# Altium footprint library myPcbLib.PcbLib: 987 footprints (part 58 of 62)
Each footprint in its own frame and in the unit in brackets; x right, y up, seen from the top. Pads: shape width x height; smd on the part's side, far side on the other; paste and mask are expansions set on the pad; w line width, h text height; cw(c..) or ccw(c..) is an arc to the next point about the centre after c.
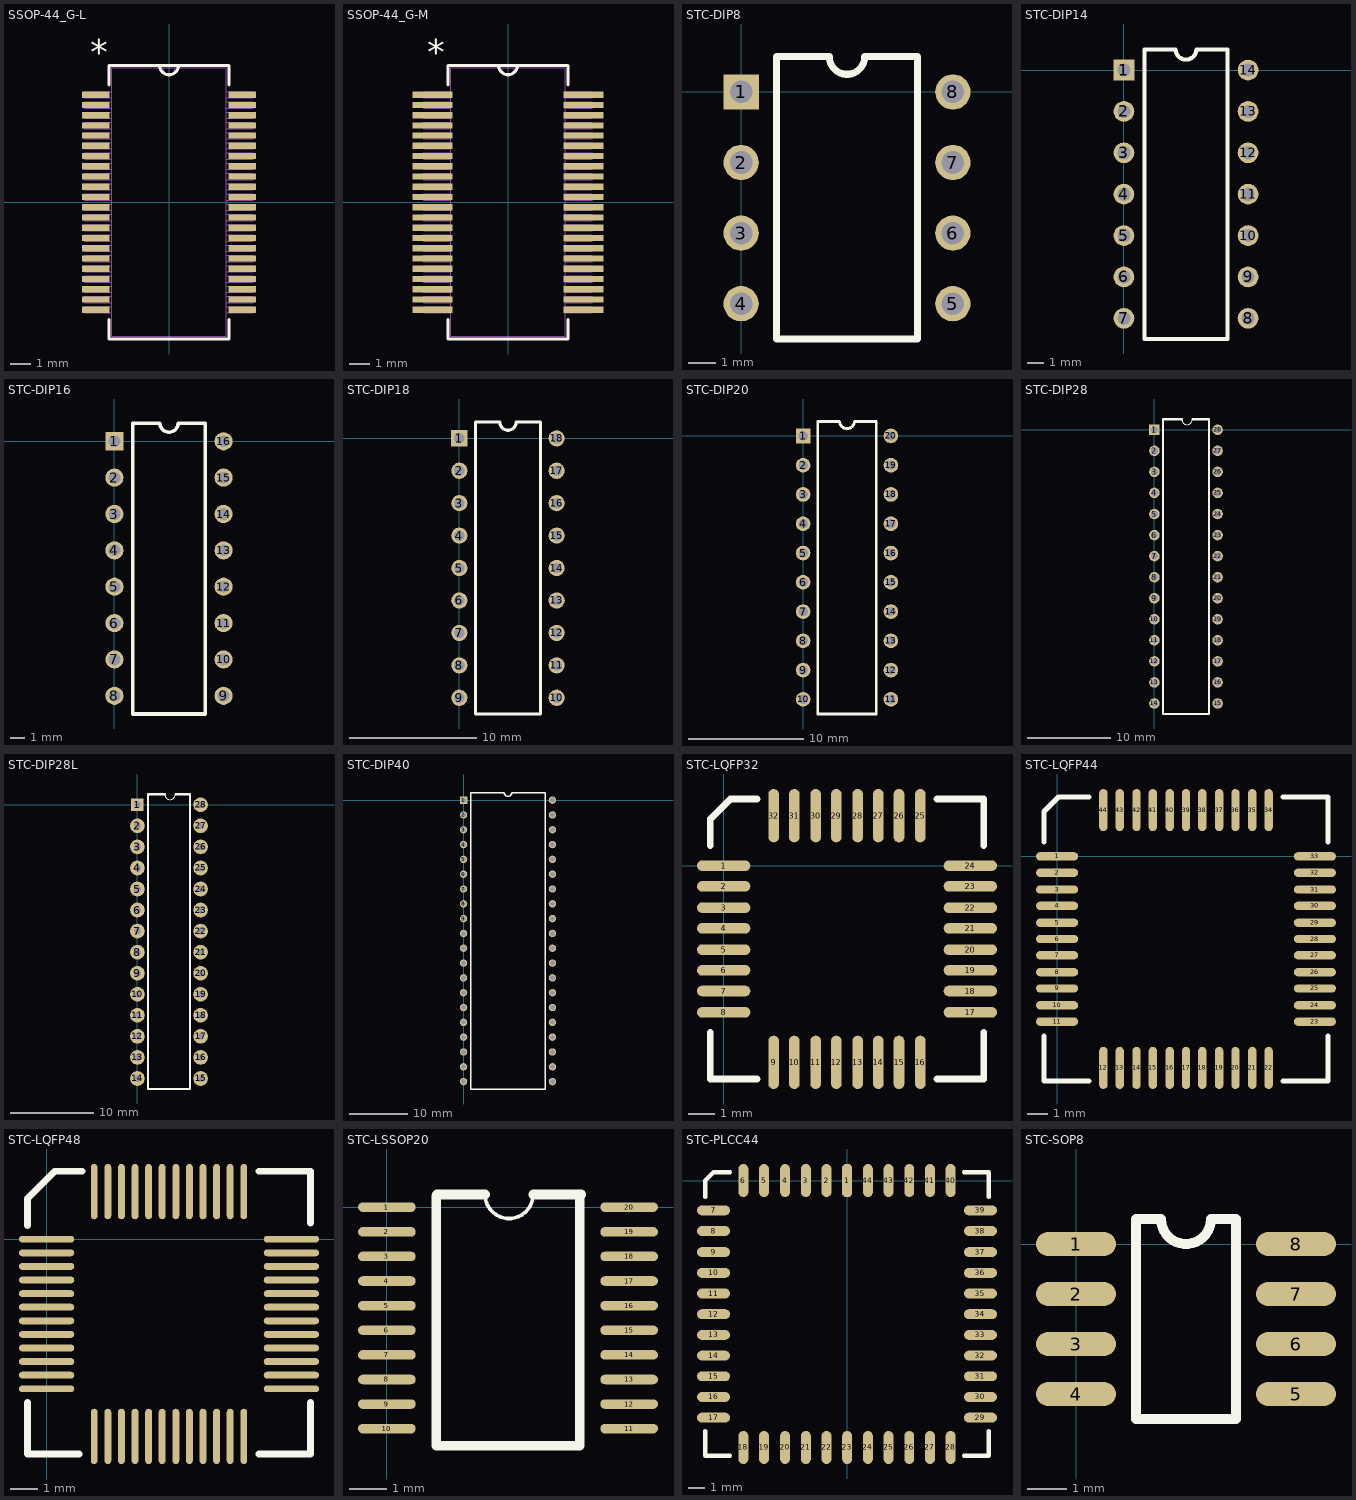
[diagram p57: the footprints below, top view; thin cyan lines are the x and y axes]

## SSOP-44_G-L [mil]
pads (44):
  rect 53x12 smd: 1(-141,206.64) 2(-141,186.96) 3(-141,167.28) 4(-141,147.6) 5(-141,127.92) 6(-141,108.24) 7(-141,88.56) 8(-141,68.88) 9(-141,49.2) 10(-141,29.52) 11(-141,9.84) 12(-141,-9.84) 13(-141,-29.52) 14(-141,-49.2) 15(-141,-68.88) 16(-141,-88.56) 17(-141,-108.24) 18(-141,-127.92) 19(-141,-147.6) 20(-141,-167.28) 21(-141,-186.96) 22(-141,-206.64) 23(141,-206.64) 24(141,-186.96) 25(141,-167.28) 26(141,-147.6) 27(141,-127.92) 28(141,-108.24) 29(141,-88.56) 30(141,-68.88) 31(141,-49.2) 32(141,-29.52) 33(141,-9.84) 34(141,9.84) 35(141,29.52) 36(141,49.2) 37(141,68.88) 38(141,88.56) 39(141,108.24) 40(141,127.92) 41(141,147.6) 42(141,167.28) 43(141,186.96) 44(141,206.64)
Top Overlay:
  lines w6: -115.5,-225.74 -115.5,-263 115.5,-263 115.5,-225.74 ; -115.5,225.74 -115.5,263 115.5,263 115.5,225.74 ; -18.11,263 ccw(c0,263) 18.11,263
  text "*" at -151,263.64 h50
Mechanical 1:
  drawing of 181 lines, arcs and shapes, not listed

## SSOP-44_G-M [mil]
pads (44):
  rect 77x12 smd: 1(-145,206.64) 2(-145,186.96) 3(-145,167.28) 4(-145,147.6) 5(-145,127.92) 6(-145,108.24) 7(-145,88.56) 8(-145,68.88) 9(-145,49.2) 10(-145,29.52) 11(-145,9.84) 12(-145,-9.84) 13(-145,-29.52) 14(-145,-49.2) 15(-145,-68.88) 16(-145,-88.56) 17(-145,-108.24) 18(-145,-127.92) 19(-145,-147.6) 20(-145,-167.28) 21(-145,-186.96) 22(-145,-206.64) 23(145,-206.64) 24(145,-186.96) 25(145,-167.28) 26(145,-147.6) 27(145,-127.92) 28(145,-108.24) 29(145,-88.56) 30(145,-68.88) 31(145,-49.2) 32(145,-29.52) 33(145,-9.84) 34(145,9.84) 35(145,29.52) 36(145,49.2) 37(145,68.88) 38(145,88.56) 39(145,108.24) 40(145,127.92) 41(145,147.6) 42(145,167.28) 43(145,186.96) 44(145,206.64)
Top Overlay:
  lines w6: -115.5,-225.74 -115.5,-263 115.5,-263 115.5,-225.74 ; -115.5,225.74 -115.5,263 115.5,263 115.5,225.74 ; -18.11,263 ccw(c0,263) 18.11,263
  text "*" at -155,263.64 h50
Mechanical 1:
  drawing of 181 lines, arcs and shapes, not listed

## STC-DIP8 [mil]
pads (8):
  rect 50x50 hole 32: 1(0,0)
  round 50 hole 32: 2(0,-100) 3(0,-200) 4(0,-300) 5(300,-300) 6(300,-200) 7(300,-100) 8(300,0)
Top Overlay:
  lines w10: 50,-350 250,-350 250,50 175,50 cw(c150,50) 125,50 50,50 50,-350

## STC-DIP14 [mil]
pads (14):
  rect 50x50 hole 32: 1(0,0)
  round 50 hole 32: 2(0,-100) 3(0,-200) 4(0,-300) 5(0,-400) 6(0,-500) 7(0,-600) 8(300,-600) 9(300,-500) 10(300,-400) 11(300,-300) 12(300,-200) 13(300,-100) 14(300,0)
Top Overlay:
  lines w10: 50,-650 50,50 125,50 ccw(c150,50) 175,50 250,50 250,-650 50,-650

## STC-DIP16 [mil]
pads (16):
  rect 50x50 hole 32: 1(0,0)
  round 50 hole 32: 2(0,-100) 3(0,-200) 4(0,-300) 5(0,-400) 6(0,-500) 7(0,-600) 8(0,-700) 9(300,-700) 10(300,-600) 11(300,-500) 12(300,-400) 13(300,-300) 14(300,-200) 15(300,-100) 16(300,0)
Top Overlay:
  lines w10: 50,-750 250,-750 250,50 175,50 cw(c150,50) 125,50 50,50 50,-750

## STC-DIP18 [mil]
pads (18):
  rect 50x50 hole 32: 1(0,0)
  round 50 hole 32: 2(0,-100) 3(0,-200) 4(0,-300) 5(0,-400) 6(0,-500) 7(0,-600) 8(0,-700) 9(0,-800) 10(300,-800) 11(300,-700) 12(300,-600) 13(300,-500) 14(300,-400) 15(300,-300) 16(300,-200) 17(300,-100) 18(300,0)
Top Overlay:
  lines w10: 50,-850 50,50 125,50 ccw(c150,50) 175,50 250,50 250,-850 50,-850

## STC-DIP20 [mil]
pads (20):
  rect 50x50 hole 32: 1(0,0)
  round 50 hole 32: 2(0,-100) 3(0,-200) 4(0,-300) 5(0,-400) 6(0,-500) 7(0,-600) 8(0,-700) 9(0,-800) 10(0,-900) 11(300,-900) 12(300,-800) 13(300,-700) 14(300,-600) 15(300,-500) 16(300,-400) 17(300,-300) 18(300,-200) 19(300,-100) 20(300,0)
Top Overlay:
  lines w10: 50,-950 250,-950 250,50 175,50 cw(c150,50) 125,50 50,50 50,-950

## STC-DIP28 [mil]
pads (28):
  rect 50x50 hole 32: 1(0,0)
  round 50 hole 32: 2(0,-100) 3(0,-200) 4(0,-300) 5(0,-400) 6(0,-500) 7(0,-600) 8(0,-700) 9(0,-800) 10(0,-900) 11(0,-1000) 12(0,-1100) 13(0,-1200) 14(0,-1300) 15(300,-1300) 16(300,-1200) 17(300,-1100) 18(300,-1000) 19(300,-900) 20(300,-800) 21(300,-700) 22(300,-600) 23(300,-500) 24(300,-400) 25(300,-300) 26(300,-200) 27(300,-100) 28(300,0)
Top Overlay:
  lines w4: 130,50 ccw(c155,50) 180,50
  lines w10: 130,50 40,50 40,-1350 260,-1350 260,50 180,50

## STC-DIP28L [mil]
pads (28):
  rect 60x60 hole 32: 1(0,0)
  round 70 hole 32: 2(0,-100) 3(0,-200) 4(0,-300) 5(0,-400) 6(0,-500) 7(0,-600) 8(0,-700) 9(0,-800) 10(0,-900) 11(0,-1000) 12(0,-1100) 13(0,-1200) 14(0,-1300) 15(300,-1300) 16(300,-1200) 17(300,-1100) 18(300,-1000) 19(300,-900) 20(300,-800) 21(300,-700) 22(300,-600) 23(300,-500) 24(300,-400) 25(300,-300) 26(300,-200) 27(300,-100) 28(300,0)
Top Overlay:
  lines w4: 130,50 ccw(c155,50) 180,50
  lines w10: 130,50 50,50 50,-1350 250,-1350 250,50 180,50

## STC-DIP40 [mil]
pads (40):
  rect 50x50 hole 32: 1(0,0)
  round 50 hole 32: 2(0,-100) 3(0,-200) 4(0,-300) 5(0,-400) 6(0,-500) 7(0,-600) 8(0,-700) 9(0,-800) 10(0,-900) 11(0,-1000) 12(0,-1100) 13(0,-1200) 14(0,-1300) 15(0,-1400) 16(0,-1500) 17(0,-1600) 18(0,-1700) 19(0,-1800) 20(0,-1900) 21(600,-1900) 22(600,-1800) 23(600,-1700) 24(600,-1600) 25(600,-1500) 26(600,-1400) 27(600,-1300) 28(600,-1200) 29(600,-1100) 30(600,-1000) 31(600,-900) 32(600,-800) 33(600,-700) 34(600,-600) 35(600,-500) 36(600,-400) 37(600,-300) 38(600,-200) 39(600,-100) 40(600,0)
Top Overlay:
  lines w10: 50,-1950 50,50 275,50 ccw(c300,50) 325,50 550,50 550,-1950 50,-1950

## STC-LQFP32 [mil]
pads (32):
  oval 80x16 smd: 1(0,0) 2(0,-31) 3(0,-63) 4(0,-94) 5(0,-126) 6(0,-157) 7(0,-188) 8(0,-220) 17(370,-220) 18(370,-188) 19(370,-157) 20(370,-126) 21(370,-94) 22(370,-63) 23(370,-31) 24(370,0)
  oval 16x80 smd: 9(75,-295) 10(106,-295) 11(138,-295) 12(169,-295) 13(201,-295) 14(232,-295) 15(263,-295) 16(295,-295) 25(295,75) 26(263,75) 27(232,75) 28(201,75) 29(169,75) 30(138,75) 31(106,75) 32(75,75)
Top Overlay:
  lines w10: -20,-250 -20,-320 50,-320 ; -20,30 -20,70 10,100 50,100 ; 320,-320 390,-320 390,-250 ; 320,100 390,100 390,30

## STC-LQFP44 [mil]
pads (44):
  oval 80x16 smd: 1(0,0) 2(0,-31) 3(0,-63) 4(0,-94) 5(0,-126) 6(0,-157) 7(0,-188) 8(0,-220) 9(0,-251) 10(0,-283) 11(0,-314) 23(490,-314) 24(490,-283) 25(490,-251) 26(490,-220) 27(490,-188) 28(490,-157) 29(490,-126) 30(490,-94) 31(490,-63) 32(490,-31) 33(490,0)
  oval 16x80 smd: 12(88,-402) 13(119,-402) 14(151,-402) 15(182,-402) 16(214,-402) 17(245,-402) 18(276,-402) 19(308,-402) 20(339,-402) 21(371,-402) 22(402,-402) 34(402,88) 35(371,88) 36(339,88) 37(308,88) 38(276,88) 39(245,88) 40(214,88) 41(182,88) 42(151,88) 43(119,88) 44(88,88)
Top Overlay:
  lines w10: -25,-342 -25,-427 60,-427 ; -25,28 -25,85 3,113 60,113 ; 430,-427 515,-427 515,-342 ; 430,113 515,113 515,28

## STC-LQFP48 [mil]
pads (48):
  oval 80x10 smd: 1(0,0) 2(0,-19.68) 3(0,-39.37) 4(0,-59.06) 5(0,-78.74) 6(0,-98.43) 7(0,-118.11) 8(0,-137.8) 9(0,-157.48) 10(0,-177.17) 11(0,-196.85) 12(0,-216.54) 25(354.33,-216.54) 26(354.33,-196.85) 27(354.33,-177.17) 28(354.33,-157.48) 29(354.33,-137.8) 30(354.33,-118.11) 31(354.33,-98.43) 32(354.33,-78.74) 33(354.33,-59.06) 34(354.33,-39.37) 35(354.33,-19.68) 36(354.33,0)
  oval 10x80 smd: 13(68.9,-285.43) 14(88.58,-285.43) 15(108.27,-285.43) 16(127.95,-285.43) 17(147.64,-285.43) 18(167.32,-285.43) 19(187.01,-285.43) 20(206.69,-285.43) 21(226.38,-285.43) 22(246.06,-285.43) 23(265.75,-285.43) 24(285.43,-285.43) 37(285.43,68.9) 38(265.75,68.9) 39(246.06,68.9) 40(226.38,68.9) 41(206.69,68.9) 42(187.01,68.9) 43(167.32,68.9) 44(147.64,68.9) 45(127.95,68.9) 46(108.27,68.9) 47(88.58,68.9) 48(68.9,68.9)
Top Overlay:
  lines w10: -27.56,-236.22 -27.56,-311.02 47.24,-311.02 ; -27.56,19.68 -27.56,59.06 11.81,98.43 51.18,98.43 ; 307.09,-311.02 381.89,-311.02 381.89,-236.22 ; 307.09,98.43 381.89,98.43 381.89,23.62

## STC-LSSOP20 [mil]
pads (20):
  oval 60x10 smd: 1(0,0) 2(0,-25.59) 3(0,-51.18) 4(0,-76.77) 5(0,-102.36) 6(0,-127.95) 7(0,-153.54) 8(0,-179.13) 9(0,-204.72) 10(0,-230.31) 11(251.97,-230.31) 12(251.97,-204.72) 13(251.97,-179.13) 14(251.97,-153.54) 15(251.97,-127.95) 16(251.97,-102.36) 17(251.97,-76.77) 18(251.97,-51.18) 19(251.97,-25.59) 20(251.97,0)
Top Overlay:
  lines w3.94: 102.13,13.19 ccw(c127.13,13.19) 152.13,13.19
  lines w10: 51.18,11.81 51.18,-248.03 200.79,-248.03 200.79,11.81 ; 52.13,13.19 102.13,13.19 ; 152.13,13.19 202.13,13.19

## STC-PLCC44 [mil]
pads (44):
  oct 24x80 smd: 1(0,0)
  oval 24x80 smd: 2(-50,0) 3(-100,0) 4(-150,0) 5(-201,0) 6(-251,0) 18(-251,-645) 19(-201,-645) 20(-150,-645) 21(-100,-645) 22(-50,-645) 23(0,-645) 24(50,-645) 25(100,-645) 26(150,-645) 27(200,-645) 28(250,-645) 40(250,0) 41(200,0) 42(150,0) 43(100,0) 44(50,0)
  oval 80x24 smd: 7(-323,-72) 8(-323,-122) 9(-323,-173) 10(-323,-223) 11(-323,-273) 12(-323,-323) 13(-323,-373) 14(-323,-423) 15(-323,-473) 16(-323,-523) 17(-323,-573) 29(322,-573) 30(322,-523) 31(322,-473) 32(322,-423) 33(322,-373) 34(322,-323) 35(322,-273) 36(322,-223) 37(322,-173) 38(322,-122) 39(322,-72)
Top Overlay:
  lines w10: -343,-605 -343,-665 -283,-665 ; -343,-40 -343,0 -323,20 -283,20 ; 282,-665 342,-665 342,-605 ; 282,20 342,20 342,-40

## STC-SOP8 [mil]
pads (8):
  oval 80x24 smd: 1(0,0) 2(0,-50) 3(0,-100) 4(0,-150) 5(220,-150) 6(220,-100) 7(220,-50) 8(220,0)
Top Overlay:
  lines w10: 60,-175 160,-175 160,25 135,25 cw(c110,25) 85,25 60,25 60,-175